# Altium footprint library Hydra_Ref_pcb.PcbLib: 353 footprints (part 8 of 23)
Each footprint in its own frame and in the unit in brackets; x right, y up, seen from the top. Pads: shape width x height; smd on the part's side, far side on the other; paste and mask are expansions set on the pad; w line width, h text height; cw(c..) or ccw(c..) is an arc to the next point about the centre after c.
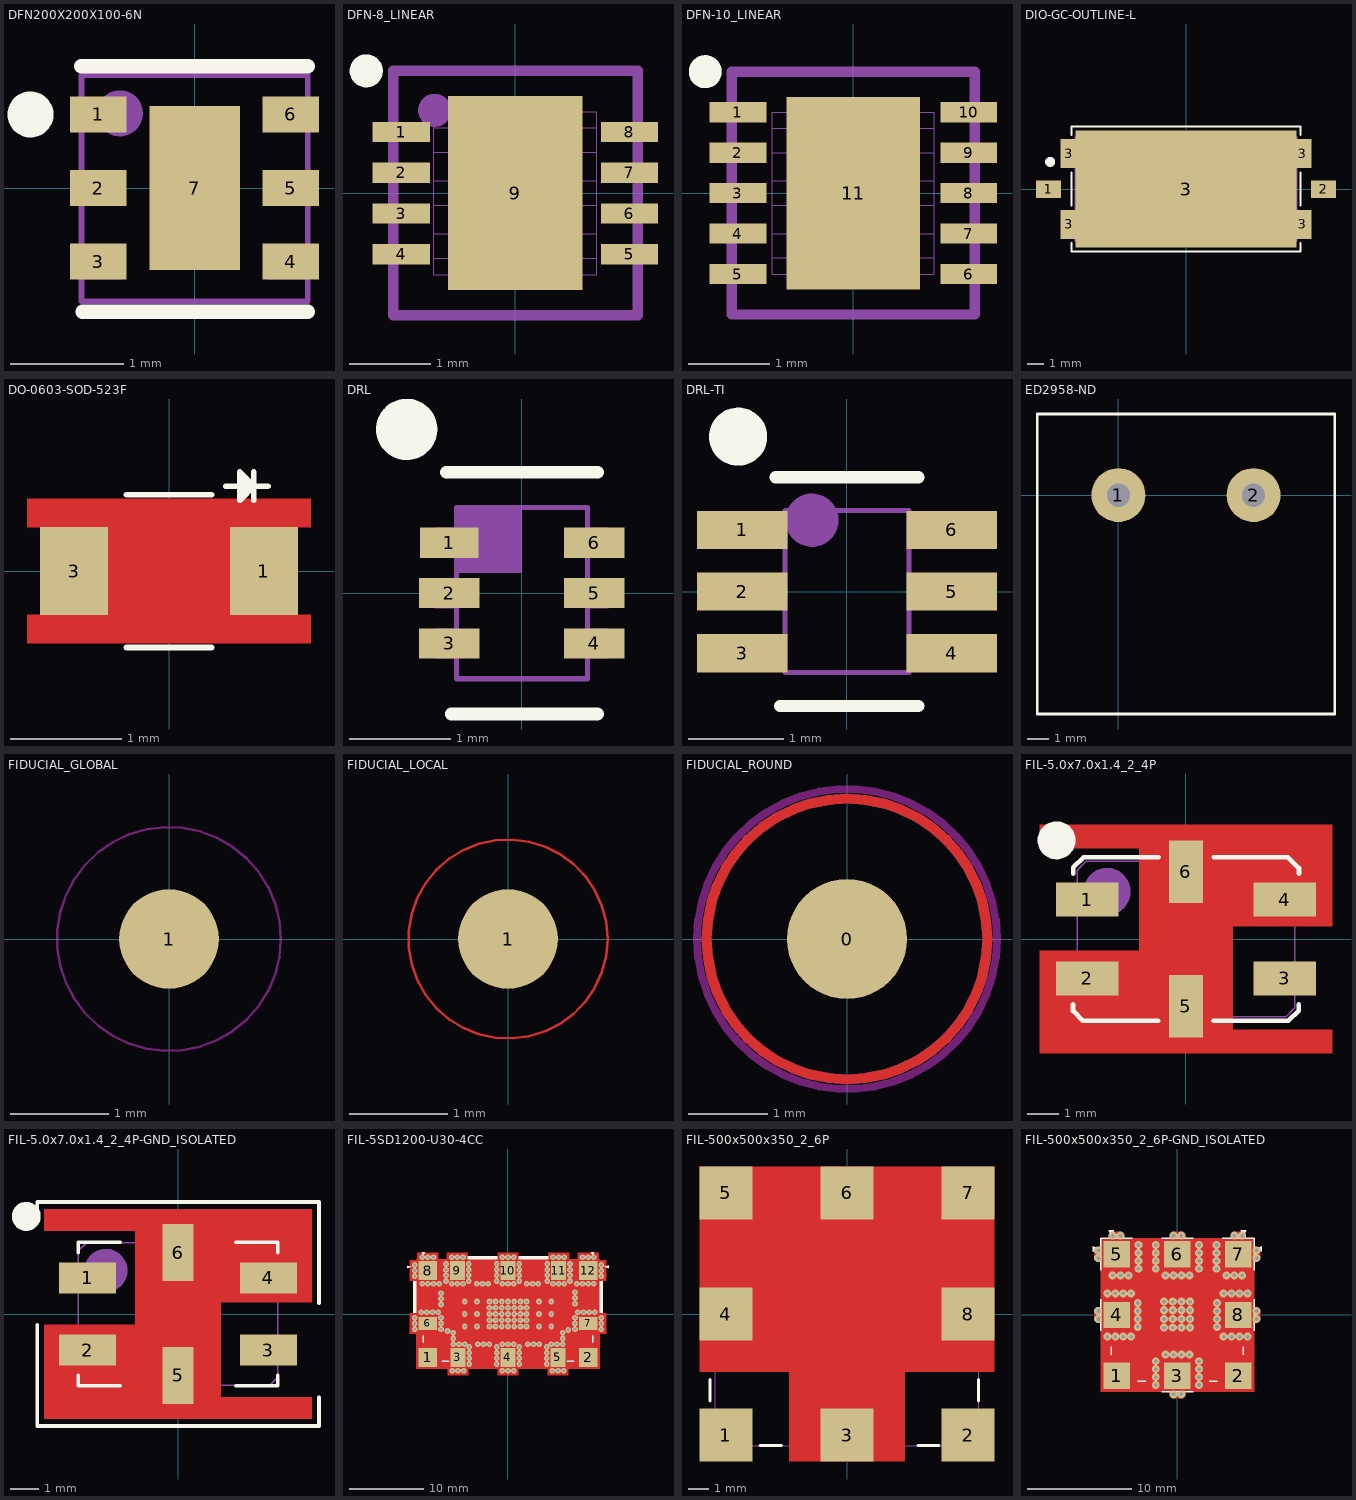
[diagram p7: the footprints below, top view; thin cyan lines are the x and y axes]

## DFN200X200X100-6N [mm]
height 1.016
pads (7):
  rect 0.5x0.32 smd mask+0.05: 1(-0.85,0.65) 2(-0.85,0) 3(-0.85,-0.65) 4(0.85,-0.65) 5(0.85,0) 6(0.85,0.65)
  rect 0.8x1.45 smd mask+0.05: 7(0,0)
Top Overlay:
  circle w0.203: c-1.45,0.65 r0.102
  lines w0.127: -1,1.075 1,1.075 ; -0.991,-1.092 1,-1.092
6 Manufacturing Notes:
  lines w0.001: -1,-0.8 -0.65,-0.8 -0.65,-0.5 -1,-0.5 ; -1,-0.15 -0.65,-0.15 -0.65,0.15 -1,0.15 ; -1,0.5 -0.65,0.5 -0.65,0.8 -1,0.8 ; 1,-0.8 0.65,-0.8 0.65,-0.5 1,-0.5 ; 1,-0.15 0.65,-0.15 0.65,0.15 1,0.15 ; 1,0.5 0.65,0.5 0.65,0.8 1,0.8 ; -1,-1 -1,1 1,1 1,-1 -1,-1
9 Top Assy:
  circle w0.203: c-0.66,0.66 r0.102
  lines w0.051: -1,-1 -1,1 1,1 1,-1 -1,-1
  text ".Designator" at -0.9,-0.3 h0.51
3D body: height 1.02, standoff 0, extent -1,-1 1,1

## DFN-8_LINEAR [mm]
height 1.905
pads (9):
  rect 0.7x0.25 smd mask+0.05: 1(-1.4,0.75) 2(-1.4,0.25) 3(-1.4,-0.25) 4(-1.4,-0.75) 5(1.4,-0.75) 6(1.4,-0.25) 7(1.4,0.25) 8(1.4,0.75)
  rect 1.65x2.38 smd mask+0.05: 9(0,0)
Top Overlay:
  circle w0.203: c-1.829,1.5 r0.102
6 Manufacturing Notes:
  lines w0.001: -1,-0.8 -0.65,-0.8 -0.65,-0.5 -1,-0.5 ; -1,-0.15 -0.65,-0.15 -0.65,0.15 -1,0.15 ; -1,0.5 -0.65,0.5 -0.65,0.8 -1,0.8 ; 1,-0.8 0.65,-0.8 0.65,-0.5 1,-0.5 ; 1,-0.15 0.65,-0.15 0.65,0.15 1,0.15 ; 1,0.5 0.65,0.5 0.65,0.8 1,0.8 ; -1,-1 -1,1 1,1 1,-1 -1,-1
9 Top Assy:
  circle w0.203: c-0.991,1.016 r0.102
  lines w0.127: -1.5,-1.5 1.5,-1.5 1.5,1.5 -1.5,1.5 -1.5,-1.5
  text ".Designator" at 0.183,-1 h0.51
3D body: height 0.75, standoff 0.01, extent -1.5,-1.5 1.5,1.5

## DFN-10_LINEAR [mm]
height 1.905
pads (11):
  rect 0.7x0.25 smd mask+0.05: 1(-1.425,1) 2(-1.425,0.5) 3(-1.425,0) 4(-1.425,-0.5) 5(-1.425,-1) 6(1.425,-1) 7(1.425,-0.5) 8(1.425,0) 9(1.425,0.5) 10(1.425,1)
  rect 1.65x2.38 smd mask+0.05: 11(0,0)
Top Overlay:
  circle w0.203: c-1.829,1.5 r0.102
6 Manufacturing Notes:
  lines w0.001: -1,-0.8 -0.65,-0.8 -0.65,-0.5 -1,-0.5 ; -1,-0.15 -0.65,-0.15 -0.65,0.15 -1,0.15 ; -1,0.5 -0.65,0.5 -0.65,0.8 -1,0.8 ; 1,-0.8 0.65,-0.8 0.65,-0.5 1,-0.5 ; 1,-0.15 0.65,-0.15 0.65,0.15 1,0.15 ; 1,0.5 0.65,0.5 0.65,0.8 1,0.8 ; -1,-1 -1,1 1,1 1,-1 -1,-1
9 Top Assy:
  circle w0.203: c-1.829,1.5 r0.102
  lines w0.127: -1.5,-1.5 1.5,-1.5 1.5,1.5 -1.5,1.5 -1.5,-1.5
  text ".Designator" at 0.183,-1 h0.51
3D body: height 0.75, standoff 0.01, extent -1.5,-1.5 1.5,1.5

## DIO-GC-OUTLINE-L [mil] "STEP RECOVERY DIODE COMB GENERATOR"
height 130
pads (7):
  rect 60x42 smd: 1(-330,0) 2(330,0)
  rect 42x70 smd: 3(-280,-85) 3(-280,85) 3(280,-85) 3(280,85)
  rect 530x280 smd paste-300: 3(0,0)
Top Overlay:
  circle w12: c-326,65 r6
  lines w5: -275,-130 -275,-150 275,-150 275,-130 ; -275,-40 -275,40 ; -275,130 -275,150 275,150 275,130 ; 275,-40 275,40
Top Paste:
  region: 190,140 110,140 110,100 190,100
  region: 190,-100 110,-100 110,-140 190,-140
  rectangle: -190,-140 -110,-100
  rectangle: -190,100 -110,140
  rectangle: -40,-140 40,-100
  rectangle: -40,100 40,140
9 Top Assy:
  circle w20: c-225,5 r10
  lines w5: -265,-125 265,-125 265,125 -265,125 -265,-125
  text ".Designator" at -165,-25 h35
3D body: height 70, standoff 0, extent 277.5,-12.5 305,12.49
3D body: height 70, standoff 0, extent -300,-12.49 -277.5,12.5
3D body: height 130, standoff 0.1, extent -265,-125 265,125

## DO-0603-SOD-523F [mil] "Metric 1608"
height 33
pads (2):
  rect 24x31 smd: 1(33.5,0) 3(-33.5,0)
Top Layer:
  pour cut-out: -50,25.5 50,25.5 50,15.5 45.5,15.5 45.5,-15.5 50,-15.5 50,-25.5 -50,-25.5 -50,-15.5 -45.5,-15.5 -45.5,15.5 -50,15.5
Top Overlay:
  region: 25,25 25,35 30,30
  lines w2: -15,-27 15,-27 ; -15,27 15,27 ; 20,30 35,30 ; 30,25 30,35 ; 25,25 30,30 25,35 25,25
Top Solder:
  pour cut-out: -53,30 53,30 53,-30 -53,-30
9 Top Assy:
  region: 16.5,19.5 16.5,-19.5 35.5,-19.5 35.5,19.5
  lines w2: -35.5,-19.5 -35.5,19.5 35.5,19.5 35.5,-19.5 -35.5,-19.5
  text ".Designator" at -25,-10 h16
3D body: height 33, standoff 0, extent -35.5,-19.5 35.5,19.5

## DRL [mm] "TEXAS  INSTRUMENTS DRL PACKAGE"
height 0.6
pads (6):
  rect 0.58x0.3 smd: 1(-0.72,0.5)
  rect 0.6x0.3 smd: 2(-0.72,0) 3(-0.72,-0.5) 4(0.72,-0.5) 5(0.72,0) 6(0.72,0.5)
Top Overlay:
  circle w0.305: c-1.143,1.626 r0.152
  lines w0.127: -0.75,1.2 0.75,1.2 ; -0.702,-1.2 0.75,-1.2
9 Top Assy:
  rectangle: -0.65,0.2 0,0.85
  lines w0.051: -0.65,-0.625 -0.85,-0.625 -0.85,-0.375 -0.65,-0.375 ; -0.65,-0.125 -0.85,-0.125 -0.85,0.125 -0.65,0.125 ; -0.65,0.375 -0.85,0.375 -0.85,0.625 -0.65,0.625 ; 0.65,-0.625 0.85,-0.625 0.85,-0.375 0.65,-0.375 ; 0.65,-0.125 0.85,-0.125 0.85,0.125 0.65,0.125 ; 0.65,0.375 0.85,0.375 0.85,0.625 0.65,0.625 ; -0.65,-0.85 -0.65,0.85 0.65,0.85 0.65,-0.85 -0.65,-0.85
  text ".Designator" at 0.4,-0.9 h0.56
3D body: height 0.6, standoff 0, extent -0.65,-0.85 0.65,0.85

## DRL-TI [mm]
height 1.092
pads (6):
  rect 0.95x0.4 smd: 1(-1.1,0.648) 2(-1.1,0) 3(-1.1,-0.648) 4(1.1,-0.648) 5(1.1,0) 6(1.1,0.648)
Top Overlay:
  circle w0.305: c-1.143,1.626 r0.152
  lines w0.127: -0.75,1.2 0.75,1.2 ; -0.702,-1.2 0.75,-1.2
9 Top Assy:
  circle w0.305: c-0.368,0.749 r0.127
  lines w0.051: -0.65,-0.749 -0.85,-0.749 -0.85,-0.545 -0.65,-0.545 ; -0.65,-0.101 -0.85,-0.101 -0.85,0.102 -0.65,0.102 ; -0.65,0.547 -0.828,0.547 -0.828,0.75 -0.65,0.75 ; 0.65,-0.749 1.05,-0.749 1.05,-0.545 0.65,-0.545 ; 0.65,-0.102 1.05,-0.102 1.05,0.102 0.65,0.102 ; 0.65,0.547 1.05,0.547 1.05,0.75 0.65,0.75 ; 0.828,-0.749 0.828,-0.545 ; 0.828,-0.102 0.828,0.102 ; 0.828,0.547 0.828,0.75 ; -0.65,-0.85 0.65,-0.85 0.65,0.85 -0.65,0.85 -0.65,-0.85
  text ".Designator" at 0.55,-0.95 h0.56
3D body: height 0.6, standoff 0, extent -0.65,-0.85 0.65,0.85

## ED2958-ND [mil] "old part - no data sheet"
pads (2):
  round 100 hole 43.2: 1(0,0) 2(250,0)
Top Overlay:
  lines w5: -150,-405 400,-405 400,150 -150,150 -150,-405
9 Top Assy:
  lines w2: -150,-405 400,-405 400,150 -150,150 -150,-405
  text ".Designator" at 20,-250 h60

## FIDUCIAL_GLOBAL [mil]
pads (1):
  round 40 all layers, no hole paste-1000 mask+40: 1(0,0)
Bottom Solder:
  region: 0,60.29 -11.76,59.13 -23.07,55.7 -33.5,50.13 -42.63,42.63 -50.13,33.5 -55.7,23.07 -59.13,11.76 -60.29,0 -59.13,-11.76 -55.7,-23.07 -50.13,-33.5 -42.63,-42.63 -33.5,-50.13 -23.07,-55.7 -11.76,-59.13 0,-60.29 11.76,-59.13 23.07,-55.7 33.5,-50.13 42.63,-42.63 50.13,-33.5 55.7,-23.07 59.13,-11.76 60.29,0 59.13,11.76 55.7,23.07 50.13,33.5 42.63,42.63 33.5,50.13 23.07,55.7 11.76,59.13
Keep-Out Layer:
  circle w1: c0,0 r45
3D body: height 0.1, standoff 0, extent -19.84,-19.95 20.01,19.97
3D body: height 0.1, standoff 0, extent -19.84,-19.95 20.01,19.97

## FIDUCIAL_LOCAL [mil] "FIDUCIAL LOCAL FOR HIGH DENCITY IC"
pads (1):
  round 40 smd paste-1000 mask+40: 1(0,0)
Top Layer:
  circle w1: c0,0 r40
Bottom Solder:
  region: 0,60.29 -11.76,59.13 -23.07,55.7 -33.5,50.13 -42.63,42.63 -50.13,33.5 -55.7,23.07 -59.13,11.76 -60.29,0 -59.13,-11.76 -55.7,-23.07 -50.13,-33.5 -42.63,-42.63 -33.5,-50.13 -23.07,-55.7 -11.76,-59.13 0,-60.29 11.76,-59.13 23.07,-55.7 33.5,-50.13 42.63,-42.63 50.13,-33.5 55.7,-23.07 59.13,-11.76 60.29,0 59.13,11.76 55.7,23.07 50.13,33.5 42.63,42.63 33.5,50.13 23.07,55.7 11.76,59.13
3D body: height 0.1, standoff 0, extent -19.84,-19.95 20,19.97

## FIDUCIAL_ROUND [mil] "FIDUCIAL ROUND"
pads (1):
  round 60 all layers, no hole paste+0 mask+43.31: 0(0,0)
Top Layer:
  circle w5: c0,0 r70
Bottom Layer:
  circle w5: c0,0 r70
Keep-Out Layer:
  circle w3.94: c0,0 r74.8
3D body: height 0.1, standoff 0, extent -29.76,-29.94 30,29.94
3D body: height 0.1, standoff 0, extent -29.76,-29.94 30,29.94

## FIL-5.0x7.0x1.4_2_4P [mil]
height 55.12
pads (6):
  rect 79x43 smd: 1(-125,50) 2(-125,-50) 3(125,-50) 4(125,50)
  rect 43x79 smd: 5(0,-85) 6(0,85)
Top Layer:
  region: -59,115 -59,-15 -185,-15 -185,-145 185,-145 185,-115 59,-115 59,16 185,16 185,145 -185,145 -185,115
Top Overlay:
  circle w24: c-164,125 r12
  lines w6: -143,-82.68 -143,-91.17 -130.47,-103.7 -35,-103.7 ; -142.8,82.68 -142.8,90.63 -129.72,103.7 -34.8,103.7 ; 34.8,-103.7 129.72,-103.7 142.8,-90.63 142.8,-82.68 ; 35,103.7 129.09,103.7 143,89.8 143,82.68
Top Solder:
  region: 190,150 179,150 179,-150 190,-150
  rectangle: -190,-150 -179,150
  rectangle: -190,-14 190,14
  rectangle: -190,85 -35,150
  rectangle: -45,138 45,150
  region: 190,150 35,150 35,85 190,85
  rectangle: -190,-150 -35,-85
  region: 45,-138 -45,-138 -45,-150 45,-150
  region: 190,-85 35,-85 35,-150 190,-150
  rectangle: -71,-138 -35,138
  region: 71,138 35,138 35,-138 71,-138
  rectangle: -45,-31 45,31
9 Top Assy:
  circle w30: c-100,60 r15
  lines w2: -137.8,-87.2 -137.8,87.2 -126.57,98.43 125.35,98.43 137.8,85.98 137.8,-87.2 126.57,-98.43 -126.57,-98.43 -137.8,-87.2
  text ".Designator" at -105,-55 h55
22 Part Dimentions & Info:
  lines w2: -137.8,-69.69 -90.55,-69.69 -90.55,-30.32 -137.8,-30.32 ; -137.8,30.32 -90.55,30.32 -90.55,69.69 -137.8,69.69 ; -19.68,-97.87 -19.68,-50 19.68,-50 19.68,-97.87 ; -19.68,97.87 -19.68,50 19.68,50 19.68,97.87 ; 137.8,-69.69 90.55,-69.69 90.55,-30.32 137.8,-30.32 ; 137.8,30.32 90.55,30.32 90.55,69.69 137.8,69.69
3D body: height 350, standoff 0, extent -190,-150 190,150

## FIL-5.0x7.0x1.4_2_4P-GND_ISOLATED [mil] "All pins isolated with solder mask"
height 55.12
pads (6):
  rect 79x43 smd: 1(-125,50) 2(-125,-50) 3(125,-50) 4(125,50)
  rect 43x79 smd: 5(0,-85) 6(0,85)
Top Layer:
  region: -59,115 -59,-15 -185,-15 -185,-145 185,-145 185,-115 59,-115 59,16 185,16 185,145 -185,145 -185,115
Top Overlay:
  circle w20: c-210,135 r10
  lines w5: -195,-15 -195,-155 195,-155 195,-115 ; -195,130 -195,155 195,155 195,15 ; -138,-85 -138,-99 -80,-99 ; -138,85 -138,99 -80,99 ; 80,-99 138,-99 138,-85 ; 80,99 138,99 138,85
Top Solder:
  region: -70,-30 70,-30 70,30 -70,30
  region: -190,75 -80,75 -80,150 -190,150
  region: -35,-140 -35,25 -70,25 -70,-140
  region: 70,-25 70,150 35,150 35,-25
  region: 190,150 -190,150 -190,140 190,140
  region: 190,150 65,150 65,85 190,85
  region: 190,-140 -190,-140 -190,-150 190,-150
  region: -190,150 -190,-150 -180,-150 -180,150
  region: 180,150 180,-150 190,-150 190,150
  region: 50,-25 190,-25 190,15 50,15
  region: -190,-15 -50,-15 -50,25 -190,25
  region: -189.8,-142.5 -34.8,-142.5 -34.8,-85 -189.8,-85
  region: 34.8,-140 185,-140 185,-75 34.8,-75
  region: 85,-150 85,-20 35,-20 35,-150
  region: -85,150 -85,20 -35,20 -35,150
9 Top Assy:
  circle w30: c-100,60 r15
  lines w2: -137.8,-87.2 -126.57,-98.43 126.57,-98.43 137.8,-87.2 137.8,85.98 125.35,98.43 -126.57,98.43 -137.8,87.2 -137.8,-87.2
  text ".Designator" at -105,-55 h60
16 Title Block:
  lines w2: -137.8,-69.69 -90.55,-69.69 -90.55,-30.32 -137.8,-30.32 ; -137.8,30.32 -90.55,30.32 -90.55,69.69 -137.8,69.69 ; -19.68,-97.87 -19.68,-50 19.68,-50 19.68,-97.87 ; -19.68,97.87 -19.68,50 19.68,50 19.68,97.87 ; 137.8,-69.69 90.55,-69.69 90.55,-30.32 137.8,-30.32 ; 137.8,30.32 90.55,30.32 90.55,69.69 137.8,69.69
3D body: height 55.12, standoff 0, extent -197.5,-157.5 197.5,157.5

## FIL-5SD1200-U30-4CC [mil]
height 280
pads (12):
  rect 100x100 smd: 1(-425,-230) 2(425,-230) 8(-425,230) 12(425,230)
  rect 80x100 smd: 3(-265,-230) 4(0,-230) 5(265,-230) 9(-268.5,230) 10(0,230) 11(268.5,230)
  rect 100x70 smd: 6(-425,-50) 7(425,-50)
via 495,-20 diameter 30 hole 14
via 495,-80 diameter 30 hole 14
via 495,-50 diameter 30 hole 14
via -229.6,-65.6 diameter 31 hole 14
via -229.6,0 diameter 31 hole 14
via -229.6,65.6 diameter 31 hole 14
via -164,-65.6 diameter 31 hole 14
via -164,0 diameter 31 hole 14
via -164,65.6 diameter 31 hole 14
via 229.6,65.6 diameter 31 hole 14
via 229.6,0 diameter 31 hole 14
via 229.6,-65.6 diameter 31 hole 14
via 164,65.6 diameter 31 hole 14
via 164,0 diameter 31 hole 14
via 164,-65.6 diameter 31 hole 14
via 60,-265 diameter 30 hole 14
via 0,-160 diameter 30 hole 14
via 60,-235 diameter 30 hole 14
via 60,-205 diameter 30 hole 14
via 60,-175 diameter 30 hole 14
via 30,-160 diameter 30 hole 14
via -30,-160 diameter 30 hole 14
via -60,-175 diameter 30 hole 14
via -60,-205 diameter 30 hole 14
via -60,-235 diameter 30 hole 14
via -60,-265 diameter 30 hole 14
via -355,-50 diameter 30 hole 14
via -355,-80 diameter 30 hole 14
via -355,-20 diameter 30 hole 14
via -370,10 diameter 30 hole 14
via -400,10 diameter 30 hole 14
via -430,10 diameter 30 hole 14
via -460,10 diameter 30 hole 14
via -328.5,265 diameter 30 hole 14
via -268.5,160 diameter 30 hole 14
via -328.5,235 diameter 30 hole 14
via -328.5,205 diameter 30 hole 14
via -328.5,175 diameter 30 hole 14
via -298.5,160 diameter 30 hole 14
via -238.5,160 diameter 30 hole 14
via -208.5,175 diameter 30 hole 14
via -208.5,205 diameter 30 hole 14
via -208.5,235 diameter 30 hole 14
via -208.5,265 diameter 30 hole 14
via 208.5,265 diameter 30 hole 14
via 268.5,160 diameter 30 hole 14
via 208.5,235 diameter 30 hole 14
via 208.5,205 diameter 30 hole 14
via 208.5,175 diameter 30 hole 14
via 238.5,160 diameter 30 hole 14
via 298.5,160 diameter 30 hole 14
via 328.5,175 diameter 30 hole 14
via 328.5,205 diameter 30 hole 14
via 328.5,235 diameter 30 hole 14
via 328.5,265 diameter 30 hole 14
via 60,265 diameter 30 hole 14
via 60,235 diameter 30 hole 14
via 60,205 diameter 30 hole 14
via 60,175 diameter 30 hole 14
via 30,160 diameter 30 hole 14
via -30,160 diameter 30 hole 14
via -60,175 diameter 30 hole 14
via -60,205 diameter 30 hole 14
via -60,235 diameter 30 hole 14
via 0,160 diameter 30 hole 14
via -60,265 diameter 30 hole 14
via 205,-265 diameter 30 hole 14
via 205,-235 diameter 30 hole 14
via 205,-205 diameter 30 hole 14
via 205,-175 diameter 30 hole 14
via 230,-160 diameter 30 hole 14
via 290,-160 diameter 30 hole 14
via 260,-160 diameter 30 hole 14
via -205,-265 diameter 30 hole 14
via -205,-235 diameter 30 hole 14
via -205,-205 diameter 30 hole 14
via -205,-175 diameter 30 hole 14
via -230,-160 diameter 30 hole 14
via -290,-160 diameter 30 hole 14
via -260,-160 diameter 30 hole 14
via 460,10 diameter 30 hole 14
via 430,10 diameter 30 hole 14
via 400,10 diameter 30 hole 14
via 370,10 diameter 30 hole 14
via 355,-20 diameter 30 hole 14
via 355,-80 diameter 30 hole 14
via 355,-50 diameter 30 hole 14
via -290,-130 diameter 30 hole 14
via -290,-100 diameter 30 hole 14
via -320.98,-90 diameter 30 hole 14
via 290,-130 diameter 30 hole 14
via 290,-100 diameter 30 hole 14
via 319.99,-85 diameter 30 hole 14
via -160,-160 diameter 30 hole 14
via -100,-160 diameter 30 hole 14
via -130,-160 diameter 30 hole 14
via 135,-160 diameter 30 hole 14
via 165,-160 diameter 30 hole 14
via 105,-160 diameter 30 hole 14
via 129.99,160 diameter 30 hole 14
via 99.99,160 diameter 30 hole 14
via 159.99,160 diameter 30 hole 14
via -135.01,160 diameter 30 hole 14
via -165.01,160 diameter 30 hole 14
via -105.01,160 diameter 30 hole 14
via -355.01,79.99 diameter 30 hole 14
via -355.01,49.99 diameter 30 hole 14
via -355.01,109.99 diameter 30 hole 14
via 354.99,85.01 diameter 30 hole 14
via 354.99,115.01 diameter 30 hole 14
via 354.99,55.01 diameter 30 hole 14
via -455,160 diameter 30 hole 14
via -395,160 diameter 30 hole 14
via -425,160 diameter 30 hole 14
via -365,160 diameter 30 hole 14
via 365,160 diameter 30 hole 14
via 425,160 diameter 30 hole 14
via 395,160 diameter 30 hole 14
via 455,160 diameter 30 hole 14
via -98.4,65.6 diameter 31 hole 14
via -65.6,65.6 diameter 31 hole 14
via -32.8,65.6 diameter 31 hole 14
via 0,65.6 diameter 31 hole 14
via 32.8,65.6 diameter 31 hole 14
via -98.4,-65.6 diameter 31 hole 14
via -98.4,-32.8 diameter 31 hole 14
via -98.4,0 diameter 31 hole 14
via -98.4,32.8 diameter 31 hole 14
via 32.8,32.8 diameter 31 hole 14
via 0,32.8 diameter 31 hole 14
via -32.8,32.8 diameter 31 hole 14
via -65.6,32.8 diameter 31 hole 14
via 32.8,0 diameter 31 hole 14
via 0,0 diameter 31 hole 14
via -32.8,0 diameter 31 hole 14
via -65.6,0 diameter 31 hole 14
via 32.8,-32.8 diameter 31 hole 14
via 0,-32.8 diameter 31 hole 14
via -32.8,-32.8 diameter 31 hole 14
via -65.6,-32.8 diameter 31 hole 14
via 32.8,-65.6 diameter 31 hole 14
via 0,-65.6 diameter 31 hole 14
via -32.8,-65.6 diameter 31 hole 14
via -65.6,-65.6 diameter 31 hole 14
via 65.6,-65.6 diameter 31 hole 14
via 65.6,-32.8 diameter 31 hole 14
via 65.6,0 diameter 31 hole 14
via 65.6,32.8 diameter 31 hole 14
via 65.6,65.6 diameter 31 hole 14
via 98.4,-65.6 diameter 31 hole 14
via 98.4,-32.8 diameter 31 hole 14
via 98.4,0 diameter 31 hole 14
via 98.4,32.8 diameter 31 hole 14
via 98.4,65.6 diameter 31 hole 14
via -495,-80 diameter 30 hole 14
via -495,-20 diameter 30 hole 14
via -495,-50 diameter 30 hole 14
via 0,-300 diameter 30 hole 14
via -30,-300 diameter 30 hole 14
via 30,-300 diameter 30 hole 14
via -495,230 diameter 30 hole 14
via -495,260 diameter 30 hole 14
via -495,200 diameter 30 hole 14
via -268.5,300 diameter 30 hole 14
via -238.5,300 diameter 30 hole 14
via -298.5,300 diameter 30 hole 14
via 0,300 diameter 30 hole 14
via 30,300 diameter 30 hole 14
via -30,300 diameter 30 hole 14
via 268.5,300 diameter 30 hole 14
via 298.5,300 diameter 30 hole 14
via 238.5,300 diameter 30 hole 14
via 495,230 diameter 30 hole 14
via 495,200 diameter 30 hole 14
via 495,260 diameter 30 hole 14
via -265,-300 diameter 30 hole 14
via -295,-300 diameter 30 hole 14
via -235,-300 diameter 30 hole 14
via 265,-300 diameter 30 hole 14
via 235,-300 diameter 30 hole 14
via 295,-300 diameter 30 hole 14
via -455,300 diameter 30 hole 14
via -395,300 diameter 30 hole 14
via -425,300 diameter 30 hole 14
via 395,300 diameter 30 hole 14
via 455,300 diameter 30 hole 14
via 425,300 diameter 30 hole 14
Top Layer:
  region: 495,-5 448.5,-5 448.5,-95 495,-95
  region: 510,-20 485,-20 485,-80 510,-80
  rectangle: -495,-95 -448.5,-5
  rectangle: -510,-80 -485,-20
  region: 30,-315 30,-290 -30,-290 -30,-315
  region: 45,-300 45,-253.5 -45,-253.5 -45,-300
  rectangle: -510,200 -485,260
  rectangle: -495,185 -448.5,275
  region: -298.5,315 -298.5,290 -238.5,290 -238.5,315
  region: -313.5,300 -313.5,253.5 -223.5,253.5 -223.5,300
  region: -30,315 -30,290 30,290 30,315
  region: -45,300 -45,253.5 45,253.5 45,300
  region: 238.5,315 238.5,290 298.5,290 298.5,315
  region: 223.5,300 223.5,253.5 313.5,253.5 313.5,300
  region: 510,260 485,260 485,200 510,200
  region: 495,275 448.5,275 448.5,185 495,185
  region: -235,-315 -235,-290 -295,-290 -295,-315
  region: -220,-300 -220,-253.5 -305,-253.5 -305,-300
  region: 295,-315 295,-290 235,-290 235,-315
  region: 305,-300 305,-253.5 220,-253.5 220,-300
  region: -470,300 -470,253.5 -380,253.5 -380,300
  region: -455,315 -455,290 -395,290 -395,315
  region: 380,300 380,253.5 470,253.5 470,300
  region: 395,315 395,290 455,290 455,315
  pour cut-out: 485,-105 520,-105 520,5 485,5
  region: -475,-110 -305,-110 -305,-280 305,-280 305,-110 475,-110 475,280 -475,280
  pour cut-out: -485,290 485,290 485,-290 -485,-290
  pour cut-out: -485,5 -520,5 -520,-105 -485,-105
  pour cut-out: -55,-290 -55,-325 55,-325 55,-290
  pour cut-out: -485,285 -520,285 -520,175 -485,175
  pour cut-out: -213.5,290 -213.5,325 -323.5,325 -323.5,290
  pour cut-out: 55,290 55,325 -55,325 -55,290
  pour cut-out: 323.5,290 323.5,325 213.5,325 213.5,290
  pour cut-out: 485,175 520,175 520,285 485,285
  pour cut-out: -320,-290 -320,-325 -210,-325 -210,-290
  pour cut-out: 210,-290 210,-325 320,-325 320,-290
  pour cut-out: -370,290 -370,325 -480,325 -480,290
  pour cut-out: 480,290 480,325 370,325 370,290
Top Overlay:
  rectangle: -502.5,5 -485,175
  rectangle: -213.5,290 -55,307.5
  rectangle: 55,290 213.5,307.5
  rectangle: 485,5 502.5,175
  region: 534,243 534,258 510,250
  region: 455.5,327 440.5,327 448.5,303
  region: -534,257 -534,242 -510,250
  region: -455.5,327 -440.5,327 -448.5,303
  lines w8: -448.5,-150 -448.5,-115 ; -348.5,-250 -315,-250 ; 315,-250 348.5,-250 ; 448.5,-150 448.5,-115
Top Paste:
  region: 474.99,40 474.99,125 374.99,125 374.99,40
  region: -475.01,125 -475.01,40 -375.01,40 -375.01,125
  region: 179.99,280 94.99,280 94.99,180 179.99,180
  region: -90.01,280 -175.01,280 -175.01,180 -90.01,180
  rectangle: 89.99,-280 174.99,-180
  rectangle: -175.01,-280 -90.01,-180
Top Solder:
  region: 494.99,0 494.99,25 349.99,25 349.99,0
  region: 479.99,35 479.99,130 369.99,130 369.99,35
  region: 494.99,140 494.99,165 349.99,165 349.99,140
  region: -495.01,165 -495.01,140 -350.01,140 -350.01,165
  region: -480.01,130 -480.01,35 -370.01,35 -370.01,130
  region: -495.01,25 -495.01,5 -350.01,5 -350.01,25
  region: 214.99,300 194.99,300 194.99,155 214.99,155
  region: 179.99,285 84.99,285 84.99,175 179.99,175
  region: 74.99,300 54.99,300 54.99,155 74.99,155
  region: -50.01,300 -70.01,300 -70.01,155 -50.01,155
  region: -85.01,285 -180.01,285 -180.01,175 -85.01,175
  region: -195,300 -215,300 -215,155 -195,155
  rectangle: 54.99,-300 74.99,-155
  rectangle: 84.99,-285 179.99,-175
  rectangle: 189.99,-300 209.99,-155
  rectangle: -75.01,-300 -55.01,-155
  rectangle: -180.01,-285 -85.01,-175
  region: 490,300 490,-300 500,-300 500,300
  region: 355,-100 355,-300 500,-300 500,-100
  rectangle: 319.99,-295 359.99,-150
  rectangle: -360.01,-300 -320.01,-155
  rectangle: -360.01,165 -325.01,300
  region: 499.99,305 -500.01,305 -500.01,295 499.99,295
  rectangle: 324.99,160 359.99,295
  region: -500,305 -500,-295 -490,-295 -490,305
  region: -490,-100 -490,-300 -345,-300 -345,-100
  rectangle: -210.01,-300 -190.01,-155
  region: 499.99,-295 -500.01,-295 -500.01,-305 499.99,-305
  region: -360,-165 360,-165 360,165 -360,165
9 Top Assy:
  lines w2: -448.5,-219 cw(c-448.5,-250) -417.5,-250 ; -448.5,-150 -348.5,-150 -348.5,-250 ; -448.5,-110 -308.5,-110 -308.5,-250 ; -448.5,-81 ccw(c-448.5,-50) -448.5,-19 ; -448.5,-50 -435,-50 ; -448.5,219 ccw(c-448.5,250) -417.5,250 ; -299.5,-250 cw(c-268.5,-250) -237.5,-250 ; -299.5,250 ccw(c-268.5,250) -237.5,250 ; -268.5,-250 -268.5,-240 ; -268.5,240 -268.5,250 ; -31.1,-250 cw(c-0.1,-250) 30.9,-250 ; -30.9,250 ccw(c0.1,250) 31.1,250 ; 0,-250 0,-240 ; 0,240 0,250 ; 237.5,-250 cw(c268.5,-250) 299.5,-250 ; 237.5,250 ccw(c268.5,250) 299.5,250 ; 268.5,-250 268.5,-240 ; 268.5,240 268.5,250 ; 308.5,-250 308.5,-110 448.5,-110 ; 348.5,-250 348.5,-150 448.5,-150 ; 417.5,-250 cw(c448.5,-250) 448.5,-219 ; 417.5,250 ccw(c448.5,250) 448.5,219 ; 435,-50 448.5,-50 ; 448.5,-81 cw(c448.5,-50) 448.5,-19 ; -448.5,-250 448.5,-250 448.5,250 -448.5,250 -448.5,-250
  text ".Designator" at -308.5,-30 h80
3D body: height 380, standoff 0, extent -505,-300 500,310

## FIL-500x500x350_2_6P [mil]
height 350
pads (8):
  rect 100x100 smd: 1(-230,-230) 2(230,-230) 3(0,-230) 4(-230,0) 5(-230,230) 6(0,230) 7(230,230) 8(230,0)
Top Layer:
  region: -280,-110 -110,-110 -110,-280 110,-280 110,-110 280,-110 280,280 -280,280
Top Overlay:
  lines w6: -260,-165 -260,-125 ; -165,-250 -125,-250 ; 135,-250 175,-250 ; 250,-165 250,-125
Top Paste:
  region: -280,-110 -110,-110 -110,-280 110,-280 110,-110 280,-110 280,280 -280,280
Top Solder:
  region: -285,-115 -115,-115 -115,-285 115,-285 115,-115 285,-115 285,285 -285,285
9 Top Assy:
  lines w2: -250,208.5 -210,208.5 -210,248.5 ; -248.5,-210 -208.5,-210 -208.5,-250 ; -248.5,-30 -208.5,-30 -208.5,20 -248.5,20 ; -25,-250 -25,-210 25,-210 25,-250 ; -25,250 -25,210 25,210 25,250 ; 208.5,250 208.5,210 248.5,210 ; 210,-248.5 210,-208.5 250,-208.5 ; 251.5,-25 210,-25 210,25 251.5,25 ; -250,-250 -250,250 250,250 250,-250 -250,-250
  text ".Designator" at -180,-30 h80
3D body: height 350, standoff 0, extent -300,-300 300,300

## FIL-500x500x350_2_6P-GND_ISOLATED [mil] "All pins isolated with solder mask"
height 350
pads (8):
  rect 100x100 smd: 1(-230,-230) 2(230,-230) 3(0,-230) 4(-230,0) 5(-230,230) 6(0,230) 7(230,230) 8(230,0)
via 245,300 diameter 30 hole 14
via 215,300 diameter 30 hole 14
via -215,300 diameter 30 hole 14
via -245,300 diameter 30 hole 14
via 15,300 diameter 30 hole 14
via -15,300 diameter 30 hole 14
via -300,245 diameter 30 hole 14
via -300,215 diameter 30 hole 14
via 300,215 diameter 30 hole 14
via 300,245 diameter 30 hole 14
via 300,-15 diameter 30 hole 14
via 300,15 diameter 30 hole 14
via -15,-300 diameter 30 hole 14
via 15,-300 diameter 30 hole 14
via -300,-15 diameter 30 hole 14
via -300,15 diameter 30 hole 14
via -17.8,-47.8 diameter 31 hole 14
via 15,-47.8 diameter 31 hole 14
via 47.8,-47.8 diameter 31 hole 14
via -17.8,-15 diameter 31 hole 14
via 15,-15 diameter 31 hole 14
via 47.8,-15 diameter 31 hole 14
via -17.8,17.8 diameter 31 hole 14
via 15,17.8 diameter 31 hole 14
via 47.8,17.8 diameter 31 hole 14
via -50.6,17.8 diameter 31 hole 14
via -50.6,-15 diameter 31 hole 14
via -50.6,-47.8 diameter 31 hole 14
via 47.8,50.6 diameter 31 hole 14
via 15,50.6 diameter 31 hole 14
via -17.8,50.6 diameter 31 hole 14
via -50.6,50.6 diameter 31 hole 14
via 148,265 diameter 30 hole 14
via 148,235 diameter 30 hole 14
via 148,205 diameter 30 hole 14
via 148,175 diameter 30 hole 14
via 185,150 diameter 30 hole 14
via 215,150 diameter 30 hole 14
via 245,150 diameter 30 hole 14
via -148,265 diameter 30 hole 14
via -148,235 diameter 30 hole 14
via -148,205 diameter 30 hole 14
via -148,175 diameter 30 hole 14
via -185,150 diameter 30 hole 14
via -215,150 diameter 30 hole 14
via -245,150 diameter 30 hole 14
via -45,150 diameter 30 hole 14
via -15,150 diameter 30 hole 14
via 15,150 diameter 30 hole 14
via 45,150 diameter 30 hole 14
via 82,175 diameter 30 hole 14
via 82,205 diameter 30 hole 14
via 82,235 diameter 30 hole 14
via 82,265 diameter 30 hole 14
via -82,265 diameter 30 hole 14
via -82,235 diameter 30 hole 14
via -82,205 diameter 30 hole 14
via -82,175 diameter 30 hole 14
via -150,-45 diameter 30 hole 14
via -150,-15 diameter 30 hole 14
via -150,15 diameter 30 hole 14
via -150,45 diameter 30 hole 14
via -175,82 diameter 30 hole 14
via -205,82 diameter 30 hole 14
via -235,82 diameter 30 hole 14
via -265,82 diameter 30 hole 14
via -265,-82 diameter 30 hole 14
via -235,-82 diameter 30 hole 14
via -205,-82 diameter 30 hole 14
via -175,-82 diameter 30 hole 14
via 45,-150 diameter 30 hole 14
via 15,-150 diameter 30 hole 14
via -15,-150 diameter 30 hole 14
via -45,-150 diameter 30 hole 14
via -82,-175 diameter 30 hole 14
via -82,-205 diameter 30 hole 14
via -82,-235 diameter 30 hole 14
via -82,-265 diameter 30 hole 14
via 82,-265 diameter 30 hole 14
via 82,-235 diameter 30 hole 14
via 82,-205 diameter 30 hole 14
via 82,-175 diameter 30 hole 14
via 150,45 diameter 30 hole 14
via 150,15 diameter 30 hole 14
via 150,-15 diameter 30 hole 14
via 150,-45 diameter 30 hole 14
via 175,-82 diameter 30 hole 14
via 205,-82 diameter 30 hole 14
via 235,-82 diameter 30 hole 14
via 265,-82 diameter 30 hole 14
via 265,82 diameter 30 hole 14
via 235,82 diameter 30 hole 14
via 205,82 diameter 30 hole 14
via 175,82 diameter 30 hole 14
Top Layer:
  region: 200,300 200,248.5 260,248.5 260,300
  region: 215,315 215,280 245,280 245,315
  region: -260,300 -260,248.5 -200,248.5 -200,300
  region: -245,315 -245,280 -215,280 -215,315
  region: -30,300 -30,248.5 30,248.5 30,300
  region: -15,315 -15,280 15,280 15,315
  rectangle: -300,200 -248.5,260
  rectangle: -315,215 -280,245
  region: 300,260 248.5,260 248.5,200 300,200
  region: 315,245 280,245 280,215 315,215
  region: 300,30 248.5,30 248.5,-30 300,-30
  region: 315,15 280,15 280,-15 315,-15
  region: 30,-300 30,-248.5 -30,-248.5 -30,-300
  region: 15,-315 15,-280 -15,-280 -15,-315
  rectangle: -315,-15 -280,15
  rectangle: -300,-30 -248.5,30
  pour cut-out: -290,290 290,290 290,-290 -290,-290
  region: -280,-110 -110,-110 -110,-280 110,-280 110,-110 280,-110 280,280 -280,280
Top Overlay:
  region: 320,260 290,250 320,240
  region: 240,320 250,290 260,320
  region: -260,320 -250,290 -240,320
  region: -320,240 -290,250 -320,260
  lines w5: -290,-60 -290,60 ; -290,170 -290,290 -170,290 ; -250,-150 -250,-120 ; -150,-250 -120,-250 ; -60,-290 60,-290 ; -60,290 60,290 ; 120,-250 150,-250 ; 170,290 290,290 290,170 ; 250,-150 250,-120 ; 290,-60 290,60
Top Solder:
  rectangle: -305,-305 -155,-65
  rectangle: 150,-165 295,-65
  rectangle: -305,65 -160,165
  rectangle: -165,-300 -65,-155
  region: -305,305 -305,-165 -295,-165 -295,305
  region: 305,305 -305,305 -305,295 305,295
  region: 295,300 295,-300 305,-300 305,300
  region: 305,-295 -165,-295 -165,-305 305,-305
  rectangle: 65,-300 300,-155
  rectangle: -165,155 -65,300
  rectangle: 65,155 165,300
  rectangle: 160,65 305,165
  region: -165,-165 165,-165 165,165 -165,165
9 Top Assy:
  lines w2: -250,208.5 -210,208.5 -210,248.5 ; -248.5,-210 -208.5,-210 -208.5,-250 ; -248.5,-30 -208.5,-30 -208.5,20 -248.5,20 ; -25,-250 -25,-210 25,-210 25,-250 ; -25,250 -25,210 25,210 25,250 ; 208.5,250 208.5,210 248.5,210 ; 210,-248.5 210,-208.5 250,-208.5 ; 251.5,-25 210,-25 210,25 251.5,25 ; -250,-250 250,-250 250,250 -250,250 -250,-250
  text ".Designator" at -135,-40 h80
3D body: height 350, standoff 0, extent -305,-305 307.5,305